# Altium footprint library Domino 3Pin.PcbLib: 350 footprints (part 21 of 22)
Each footprint in its own frame and in the unit in brackets; x right, y up, seen from the top. Pads: shape width x height; smd on the part's side, far side on the other; paste and mask are expansions set on the pad; w line width, h text height; cw(c..) or ccw(c..) is an arc to the next point about the centre after c.
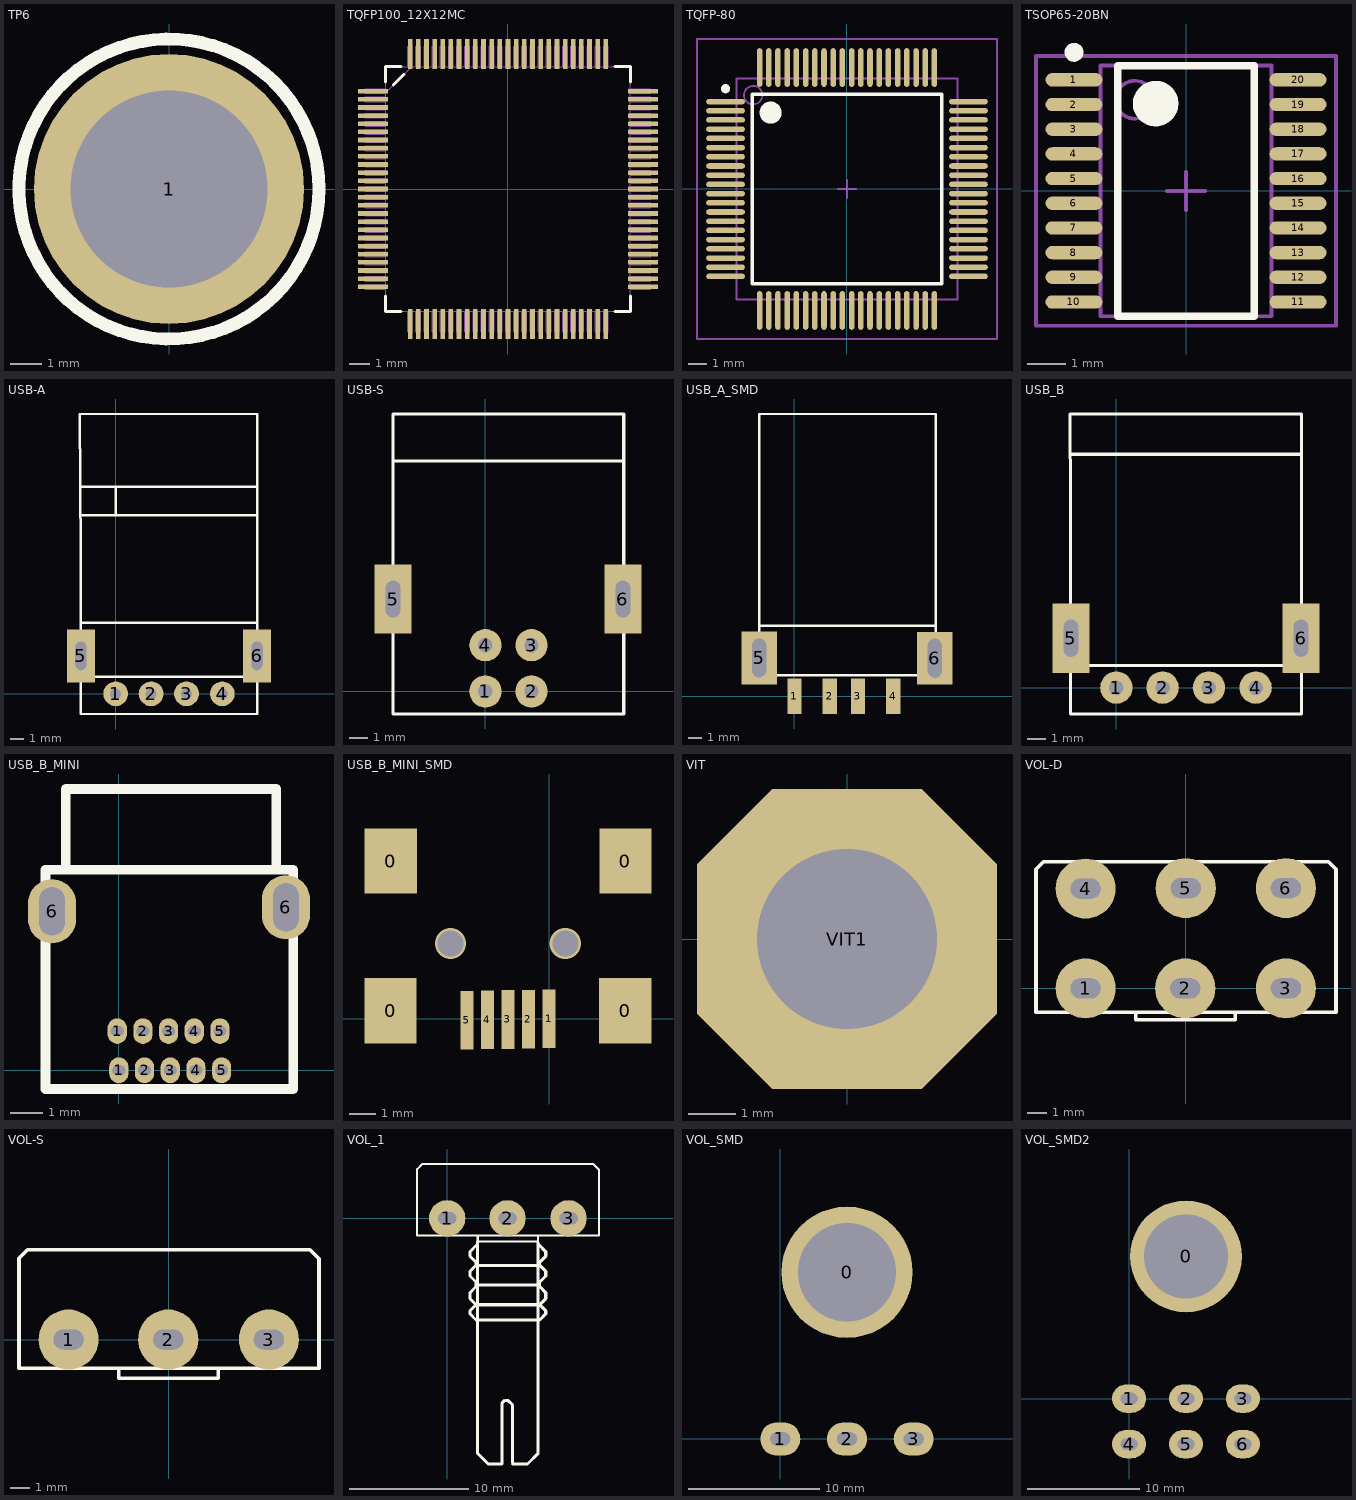
[diagram p20: the footprints below, top view; thin cyan lines are the x and y axes]

## TP6 [mm] "Jac cap 6ly"
height 3.81
pads (1):
  round 8.5 hole 6.2: 1(0,0)
Top Overlay:
  circle w0.406: c0,0 r4.724

## TQFP100_12X12MC [mil]
pads (100):
  rect 58x9 smd: 1(-260.59,188.98) 2(-260.59,173.23) 3(-260.59,157.48) 4(-260.59,141.73) 5(-260.59,125.98) 6(-260.59,110.24) 7(-260.59,94.49) 8(-260.59,78.74) 9(-260.59,62.99) 10(-260.59,47.24) 11(-260.59,31.5) 12(-260.59,15.75) 13(-260.59,0) 14(-260.59,-15.75) 15(-260.59,-31.5) 16(-260.59,-47.24) 17(-260.59,-62.99) 18(-260.59,-78.74) 19(-260.59,-94.49) 20(-260.59,-110.24) 21(-260.59,-125.98) 22(-260.59,-141.73) 23(-260.59,-157.48) 24(-260.59,-173.23) 25(-260.59,-188.98) 51(260.59,-188.98) 52(260.59,-173.23) 53(260.59,-157.48) 54(260.59,-141.73) 55(260.59,-125.98) 56(260.59,-110.24) 57(260.59,-94.49) 58(260.59,-78.74) 59(260.59,-62.99) 60(260.59,-47.24) 61(260.59,-31.5) 62(260.59,-15.75) 63(260.59,0) 64(260.59,15.75) 65(260.59,31.5) 66(260.59,47.24) 67(260.59,62.99) 68(260.59,78.74) 69(260.59,94.49) 70(260.59,110.24) 71(260.59,125.98) 72(260.59,141.73) 73(260.59,157.48) 74(260.59,173.23) 75(260.59,188.98)
  rect 9x58 smd: 26(-188.98,-260.59) 27(-173.23,-260.59) 28(-157.48,-260.59) 29(-141.73,-260.59) 30(-125.98,-260.59) 31(-110.24,-260.59) 32(-94.49,-260.59) 33(-78.74,-260.59) 34(-62.99,-260.59) 35(-47.24,-260.59) 36(-31.5,-260.59) 37(-15.75,-260.59) 38(0,-260.59) 39(15.75,-260.59) 40(31.5,-260.59) 41(47.24,-260.59) 42(62.99,-260.59) 43(78.74,-260.59) 44(94.49,-260.59) 45(110.24,-260.59) 46(125.98,-260.59) 47(141.73,-260.59) 48(157.48,-260.59) 49(173.23,-260.59) 50(188.98,-260.59) 76(188.98,260.59) 77(173.23,260.59) 78(157.48,260.59) 79(141.73,260.59) 80(125.98,260.59) 81(110.24,260.59) 82(94.49,260.59) 83(78.74,260.59) 84(62.99,260.59) 85(47.24,260.59) 86(31.5,260.59) 87(15.75,260.59) 88(0,260.59) 89(-15.75,260.59) 90(-31.5,260.59) 91(-47.24,260.59) 92(-62.99,260.59) 93(-78.74,260.59) 94(-94.49,260.59) 95(-110.24,260.59) 96(-125.98,260.59) 97(-141.73,260.59) 98(-157.48,260.59) 99(-173.23,260.59) 100(-188.98,260.59)
Top Overlay:
  lines w6: -236.22,-206.58 -236.22,-236.22 -206.58,-236.22 ; -236.22,206.58 -236.22,236.22 -206.58,236.22 ; -221.11,201.33 -201.33,221.11 ; 206.58,-236.22 236.22,-236.22 236.22,-206.58 ; 206.58,236.22 236.22,236.22 236.22,206.58
Mechanical 1:
  drawing of 405 lines, arcs and shapes, not listed
3D body "User Library-TQFP100-10x10x05.step": height 39.97, standoff 0.6, extent -275.81,-278.81 275.37,272.37

## TQFP-80 [mm] "Thin QFP, 80-Leads, Body 12x12mm, Pitch 0.5mm, IPC Low Density"
height 1.2
pads (80):
  oval 2.1x0.3 smd: 1(-6.6,4.75) 2(-6.6,4.25) 3(-6.6,3.75) 4(-6.6,3.25) 5(-6.6,2.75) 6(-6.6,2.25) 7(-6.6,1.75) 8(-6.6,1.25) 9(-6.6,0.75) 10(-6.6,0.25) 11(-6.6,-0.25) 12(-6.6,-0.75) 13(-6.6,-1.25) 14(-6.6,-1.75) 15(-6.6,-2.25) 16(-6.6,-2.75) 17(-6.6,-3.25) 18(-6.6,-3.75) 19(-6.6,-4.25) 20(-6.6,-4.75) 41(6.6,-4.75) 42(6.6,-4.25) 43(6.6,-3.75) 44(6.6,-3.25) 45(6.6,-2.75) 46(6.6,-2.25) 47(6.6,-1.75) 48(6.6,-1.25) 49(6.6,-0.75) 50(6.6,-0.25) 51(6.6,0.25) 52(6.6,0.75) 53(6.6,1.25) 54(6.6,1.75) 55(6.6,2.25) 56(6.6,2.75) 57(6.6,3.25) 58(6.6,3.75) 59(6.6,4.25) 60(6.6,4.75)
  oval 0.3x2.1 smd: 21(-4.75,-6.6) 22(-4.25,-6.6) 23(-3.75,-6.6) 24(-3.25,-6.6) 25(-2.75,-6.6) 26(-2.25,-6.6) 27(-1.75,-6.6) 28(-1.25,-6.6) 29(-0.75,-6.6) 30(-0.25,-6.6) 31(0.25,-6.6) 32(0.75,-6.6) 33(1.25,-6.6) 34(1.75,-6.6) 35(2.25,-6.6) 36(2.75,-6.6) 37(3.25,-6.6) 38(3.75,-6.6) 39(4.25,-6.6) 40(4.75,-6.6) 61(4.75,6.6) 62(4.25,6.6) 63(3.75,6.6) 64(3.25,6.6) 65(2.75,6.6) 66(2.25,6.6) 67(1.75,6.6) 68(1.25,6.6) 69(0.75,6.6) 70(0.25,6.6) 71(-0.25,6.6) 72(-0.75,6.6) 73(-1.25,6.6) 74(-1.75,6.6) 75(-2.25,6.6) 76(-2.75,6.6) 77(-3.25,6.6) 78(-3.75,6.6) 79(-4.25,6.6) 80(-4.75,6.6)
Top Overlay:
  circle w0.6: c-4.15,4.15 r0.3
  circle w0.25: c-6.6,5.45 r0.125
  lines w0.2: -5.15,-5.15 5.15,-5.15 5.15,5.15 -5.15,5.15 -5.15,-5.15
Mechanical 13:
  circle w0.1: c-5.1,5.1 r0.5
  lines w0.1: -6,-6 6,-6 6,6 -6,6 -6,-6
Mechanical 15:
  lines w0.1: -0.5,0 0.5,0 ; 0,-0.5 0,0.5 ; -8.15,-8.15 8.15,-8.15 8.15,8.15 -8.15,8.15 -8.15,-8.15
3D body: height 1.2, standoff 0, extent -6,-6 6,6

## TSOP65-20BN [mm] "TSOP, 20-Leads, Body 6.5x4.4mm, Pitch 0.65mm, IPC Medium Density"
height 1.2
pads (20):
  oval 1.5x0.35 smd: 1(-2.95,2.925) 2(-2.95,2.275) 3(-2.95,1.625) 4(-2.95,0.975) 5(-2.95,0.325) 6(-2.95,-0.325) 7(-2.95,-0.975) 8(-2.95,-1.625) 9(-2.95,-2.275) 10(-2.95,-2.925) 11(2.95,-2.925) 12(2.95,-2.275) 13(2.95,-1.625) 14(2.95,-0.975) 15(2.95,-0.325) 16(2.95,0.325) 17(2.95,0.975) 18(2.95,1.625) 19(2.95,2.275) 20(2.95,2.925)
Top Overlay:
  circle w0.6: c-0.8,2.3 r0.3
  circle w0.25: c-2.95,3.65 r0.125
  lines w0.2: -1.8,-3.3 1.8,-3.3 1.8,3.3 -1.8,3.3 -1.8,-3.3
Mechanical 13:
  circle w0.1: c-1.35,2.4 r0.5
  lines w0.1: -2.25,-3.3 2.25,-3.3 2.25,3.3 -2.25,3.3 -2.25,-3.3
Mechanical 15:
  lines w0.1: -0.5,0 0.5,0 ; 0,-0.5 0,0.5 ; -3.95,-3.55 3.95,-3.55 3.95,3.55 -3.95,3.55 -3.95,-3.55
3D body: height 1.2, standoff 0, extent -2.25,-3.3 2.25,3.3

## USB-A [mil]
pads (6):
  round 70 hole 31: 1(0,0) 2(100,0) 3(200,0) 4(301,0)
  rect 80x150 hole 31 slot 80 at 90 deg: 5(-98,107) 6(399,107)
Top Overlay:
  lines w7: -99,200 400,200 ; -99,504 400,504 ; -99,584 400,584 ; -98,48 401,48 ; 0,504 0,584 ; -101.03,790 -99,397 -99,-57 400,-57 400,790 -101.03,790
3D body "usb_a-usb_a-lp-c.stp": height 177.17, standoff -51.16, extent -97.29,-0.22 399,784.22

## USB-S [mil] "USB B connector, 4pin, For Print"
height 100
pads (6):
  round 70 hole 31: 1(0,0) 2(100,0) 3(100,100) 4(0,100)
  rect 80x150 hole 31 slot 80 at 90 deg: 5(-200,200) 6(298,200)
Top Overlay:
  lines w7: -200,499 300,499 ; -200,-49 300,-49 300,601 -200,601 -200,-49
3D body "usb_a-usbsb.stp": height 421.26, standoff -155.51, extent -243.31,-39.61 343.31,610

## USB_A_SMD [mil] "For USB SMD"
height 150
pads (6):
  rect 40x100 smd: 1(0,0) 2(100,0) 3(180,0) 4(280,0)
  rect 100x150 hole 40 slot 110 at 90 deg: 5(-100,109) 6(398,108)
Top Overlay:
  lines w7: -100,200 400,200 ; -100,60 -100,800 400,800 400,60 -100,60
3D body "SW3dPS-USB Series A Plug.STEP": height 73.83, standoff -103.33, extent -93.44,62.17 379,783.83

## USB_B [mil] "USB A connector, 4pin, For USB sing"
height 100
pads (6):
  round 70 hole 31: 1(0,0) 2(100,0) 3(200,0) 4(301,0)
  rect 80x150 hole 31 slot 80 at 90 deg: 5(-98,107) 6(399,107)
Top Overlay:
  lines w7: -99,504 400,504 ; -98,48 401,48 ; -100,591 400,591 400,-57 -99,-57 -99,397 -100,591
3D body "usb_a-usbsa.stp": height 277.51, standoff -149.84, extent -162.02,-58 460.02,512.87

## USB_B_MINI [mm]
pads (12):
  oval 0.6x0.8 hole 0.3 slot 0.4 at 0 deg: 1(-0.051,1.219) 1(0,0) 2(0.749,1.219) 2(0.8,0) 3(1.549,1.219) 3(1.6,0) 4(2.349,1.219) 4(2.4,0) 5(3.149,1.219) 5(3.2,0)
  oval 1.5x2 hole 0.8 slot 1.5 at 90 deg: 6(-2.083,4.953) 6(5.207,5.08)
Top Overlay:
  lines w0.3: -1.651,6.299 -1.651,8.763 4.902,8.763 4.902,6.35 ; -2.286,-0.584 -2.286,6.248 5.436,6.248 5.436,-0.584 -2.286,-0.584
3D body "usb_b_mini_dip.stp": height 3.92, standoff -1.68, extent -2.266,-0.561 5.436,8.791

## USB_B_MINI_SMD [mm]
pads (9):
  rect 2x2.5 smd: 0(-6.075,0.305) 0(-6.071,6.045) 0(2.925,0.305) 0(2.929,6.045)
  rect 0.5x2.25 smd: 1(0,0) 2(-0.787,-0.013) 3(-1.575,-0.025) 4(-2.362,-0.038) 5(-3.15,-0.051)
via -3.775,2.885 diameter 1.2 hole 1
via 0.625,2.885 diameter 1.2 hole 1
3D body "User Library-USB_mini_B.step": height 3.95, standoff -1, extent -6.925,-0.368 3.775,8.832

## VIT [mil] "VIT"
height 0.2
pads (1):
  oct 250x250 hole 150: VIT1(0,0)

## VOL-D [mil] "Volume control Dual"
height 400
pads (6):
  round 120 hole 40 slot 60 at 0 deg: 1(-200,0) 2(-1,0) 3(200,0) 4(-200,199) 5(0,200) 6(200,200)
Top Overlay:
  lines w7: -100,-48 -100,-63 99,-63 99,-48 ; -299,-48 -299,238 -284,253 285,253 300,238 300,-48 -299,-48
3D body "SW3dPS-ALPHA-potentiometer stereo PCB mount.STEP": height 834.65, standoff -129.92, extent -338.65,-1309.27 330.65,299

## VOL-S [mil] "Volume control single"
height 400
pads (3):
  round 120 hole 40 slot 60 at 0 deg: 1(-200,0) 2(-1,0) 3(200,0)
Top Overlay:
  lines w7: -100,-57 -100,-77 99,-77 99,-57 ; -299,-57 -299,162 -282,179 282,179 300,161 300,-57 -299,-57

## VOL_1 [mil]
pads (3):
  round 120 hole 40 slot 60 at 0 deg: 1(0,0) 2(199,0) 3(400,0)
Top Overlay:
  lines w7: 100,-57 100,-77 299,-77 299,-57 ; 101,-77 101,-57 ; -99,-57 500,-57 500,161 482,179 -82,179 -99,162 -99,-57
  lines w10: 95,-335 75,-315 75,-305 95,-285 75,-265 75,-245 95,-225 95,-210 75,-190 75,-175 95,-155 95,-145 75,-125 75,-110 100,-85 ; 95,-220 300,-220 ; 100,-770 100,-77 ; 100,-760 100,-775 135,-810 180,-810 180,-610 190,-600 200,-600 215,-615 215,-805 ; 100,-335 305,-335 325,-315 325,-305 305,-285 ; 100,-285 305,-285 ; 105,-155 300,-155 ; 215,-810 265,-810 300,-775 ; 300,-770 300,-80 ; 300,-85 325,-110 325,-125 305,-145 305,-155 325,-175 325,-190 305,-210 305,-225 325,-245 325,-265 305,-285
3D body "SW3dPS-Pot.STEP": height 839.35, standoff -130, extent -110,-818.11 510,188.11

## VOL_SMD [mil]
pads (4):
  round 393.7 hole 295.28: 0(200,500)
  oval 120x100 hole 40 slot 60 at 0 deg: 1(0,0) 2(200,0) 3(400,0)
Bottom Overlay:
  circle w12: c200,500 r215.01
  circle w12: c0,150 r50
  circle w12: c200,150 r50
  circle w12: c400,150 r50
  lines w12: -57.25,301.71 cw(c200,500) 455.57,299.55 ; -55,299 127,299 ; -49,700 119,700 ; 281,298 455,298 ; 286,698 454,698 ; 455,295 500,250 500,-75 -100,-75 -100,255 ; -100,255 -55,300 -100,255
3D body "SW3dPS-omeg pot.STEP": height 866.14, standoff -407.48, extent -203.15,-247.08 600,947.08

## VOL_SMD2 [mil]
pads (7):
  round 393.7 hole 295.28: 0(200,500)
  oval 120x100 hole 40 slot 60 at 0 deg: 1(0,0) 2(200,0) 3(400,0) 4(0,-160) 5(200,-160) 6(400,-160)
Bottom Overlay:
  circle w12: c400,150 r50
  circle w12: c200,150 r50
  circle w12: c0,150 r50
  circle w12: c200,500 r215.01
  lines w12: -100,-70 -100,-230 500,-230 500,-70 ; -57.25,301.71 cw(c200,500) 455.57,299.55 ; -55,299 127,299 ; -49,700 119,700 ; 281,298 455,298 ; 286,698 454,698 ; 455,295 500,250 500,-75 -100,-75 -100,255 ; -100,255 -55,300 -100,255